# Altium schematic symbol library IC_ADI.SCHLIB: 3169 symbols (part 128 of 181) (continued)
## AD8041AR (continued)

## AD8042AN
designator U?
Double Channel Low Power Operational Amplifier, 170 MHz BW, 225 V/us SR, Industrial, 8-pin DIP (N-8), Tube; Generic Part Number: AD8042; PartNumber: AD8042AN; Amplifiers Per Package: 2; Input Bias Current: 1.2uA; Input Offset Voltage: 3mV; Iq/Amp: 7mA; Small Signal Bandwidth: 170MHz; V Span Max: 12V; V Span Min: 3V; DatasheetVersion: Rev. E; PackageVersion: 070606-A; PackageReference: N-8; PackageDescription: 8-Pin Plastic Dual In-Line Package, Row spacing 7.62 mm, Pitch 2.54 mm; Supplier Part Number 1: AD8042AN-ND; Supplier Part Number 2: 52F8033; Slew Rate: 225V/us; Mounting Technology: Through Hole; Code_JEDEC: MS-001; ComponentLink1Description: Manufacturer URL; ComponentLink2Description: Datasheet; ComponentLink3Description: Package Specification; ComponentLink4Description: Reference Circuit
footprint DIP8 (Footprint not found)
pins on every part: 4 -VS (power), 8 +VS (power)
part A pins: 1 OUT 1 (out), 2 -IN 1 (in), 3 +IN 1 (in)
part B pins: 5 +IN 2 (in), 6 -IN 2 (in), 7 OUT 2 (out)

## AD8042AR
designator U?
Double Channel Low Power Operational Amplifier, 170 MHz BW, 225 V/us SR, Industrial, 8-pin SOIC (R-8), Tube; Generic Part Number: AD8042; PartNumber: AD8042AR; Amplifiers Per Package: 2; Input Bias Current: 1.2uA; Input Offset Voltage: 3mV; Iq/Amp: 7mA; Small Signal Bandwidth: 170MHz; V Span Max: 12V; V Span Min: 3V; DatasheetVersion: Rev. E; PackageVersion: 060506-A; PackageReference: R-8; PackageDescription: 8-Pin Standard Small Outline Package, Body 3.9 x 4.9 mm, Pitch 1.27 mm; Supplier Part Number 1: AD8042AR-ND; Slew Rate: 225V/us; Mounting Technology: Surface Mount; Code_JEDEC: MS-012-AA; ComponentLink1Description: Manufacturer URL; ComponentLink2Description: Datasheet; ComponentLink3Description: Package Specification; ComponentLink4Description: Reference Circuit
footprint SOIC8_1.27 (Footprint not found)
pins on every part: 4 -VS (power), 8 +VS (power)
part A pins: 1 OUT 1 (out), 2 -IN 1 (in), 3 +IN 1 (in)
part B pins: 5 +IN 2 (in), 6 -IN 2 (in), 7 OUT 2 (out)

## AD8044AR-14
designator U?
Quad Channel Low Power Operational Amplifier, 160 MHz BW, 190 V/us SR, Industrial, 14-pin SOIC (R-14), Tube; Generic Part Number: AD8044; PartNumber: AD8044AR-14; Amplifiers Per Package: 4; Input Bias Current: 2uA; Input Offset Voltage: 1.4mV; Iq/Amp: 3.4mA; Small Signal Bandwidth: 160MHz; V Span Max: 12V; V Span Min: 3V; DatasheetVersion: Rev. B; PackageVersion: 060606-A; PackageReference: R-14; PackageDescription: 14-Pin Standard Small Outline Package, Body 8.65 x 3.9 mm, Pitch 1.27 mm; Supplier Part Number 1: AD8044AR-14-ND; Slew Rate: 190V/us; Mounting Technology: Surface Mount; Code_JEDEC: MS-012-AB; ComponentLink1Description: Manufacturer URL; ComponentLink2Description: Datasheet; ComponentLink3Description: Package Specification
footprint SOIC14_1.27 (Footprint not found)
pins on every part: 4 +V (power), 11 -V (power)
part A pins: 1 OUT A (out), 2 -IN A (in), 3 +IN A (in)
part B pins: 5 +IN B (in), 6 -IN B (in), 7 OUT B (out)
part C pins: 8 OUT C (out), 9 -IN C (in), 10 +IN C (in)
part D pins: 12 +IN D (in), 13 -IN D (in), 14 OUT D (out)

## AD8045ACPZ-R2
designator U?
Single Channel Ultra Low Distortion  Operational Amplifier, 1 GHz BW, 1.35 KV/us SR, Industrial, 8-pin QFN (CP-8-2), Reel; Generic Part Number: AD8045; PartNumber: AD8045ACPZ-R2; Amplifiers Per Package: 1; Input Bias Current: 2uA; Input Offset Voltage: 200uV; Iq/Amp: 19mA; Small Signal Bandwidth: 1GHz; V Span Max: 12V; V Span Min: 3.3V; DatasheetVersion: Rev. A; PackageVersion: 061507-B; PackageReference: CP-8-2; PackageDescription: 8-Pin Lead Frame Chip Scale Package, Body 3 x 3 mm, Pitch 0.5 mm; Supplier Part Number 1: 1078299; Supplier Part Number 2: 1078299RL; Supplier Part Number 3: 59K6288; Slew Rate: 1.35KV/us; Mounting Technology: Surface Mount; ComponentLink1Description: Manufacturer URL; ComponentLink2Description: Datasheet; ComponentLink3Description: Package Specification
footprint DFN8_0.5-PAD(3X3) (Footprint not found)
pins: 1 NC "No Connect", 2 FEEDBACK (out) "Feedback Pin", 3 -IN (in) "Inverting Input", 4 +IN (in) "Noninverting Input", 5 -VS (power) "Negative Supply", 6 NC "No Connect", 7 OUT (out) "Output", 8 +VS (power) "Positive Supply", 9 EP (power) "Must Be Connected to -VS or Electrically Isolated"

## AD8045ARDZ
designator U?
Single Channel Ultra Low Distortion  Operational Amplifier, 1 GHz BW, 1.35 KV/us SR, Industrial, 8-pin SOIC (RD-8-1), Tube; Generic Part Number: AD8045; PartNumber: AD8045ARDZ; Amplifiers Per Package: 1; Input Bias Current: 2uA; Input Offset Voltage: 200uV; Iq/Amp: 19mA; Small Signal Bandwidth: 1GHz; V Span Max: 12V; V Span Min: 3.3V; DatasheetVersion: Rev. A; PackageVersion: 060506-A; PackageReference: RD-8-1; PackageDescription: 8-Pin Standard Small Outline Package, Body 4.9 x 3.9 mm, Pitch 1.27 mm; Supplier Part Number 1: AD8045ARDZ-ND; Supplier Part Number 2: 9079424; Supplier Part Number 3: 19M0920; Slew Rate: 1.35KV/us; Mounting Technology: Surface Mount; Code_JEDEC: MS-012-AA; ComponentLink1Description: Manufacturer URL; ComponentLink2Description: Datasheet; ComponentLink3Description: Package Specification
footprint SOIC8_1.27-PAD (Footprint not found)
pins: 1 FEEDBACK (out) "Feedback Pin", 2 -IN (in) "Inverting Input", 3 +IN (in) "Noninverting Input", 4 -VS (power) "Negative Supply", 5 NC, 6 OUT (out) "Output", 7 +VS (power) "Positive Supply", 8 NC, 9 EP (power) "Must Be Connected to -VS or Electrically Isolated"

## AD8051AR
designator U?
Single Channel Single-Supply Operation Operational Amplifier, 110 MHz BW, 170 V/us SR, Industrial, 8-pin SOIC (R-8), Tube; Generic Part Number: AD8051; PartNumber: AD8051AR; Amplifiers Per Package: 1; Input Bias Current: 1.4uA; Input Offset Voltage: 1.7mV; Iq/Amp: 5.5mA; Small Signal Bandwidth: 110MHz; V Span Max: 12V; V Span Min: 3V; DatasheetVersion: Rev. J; PackageVersion: 060506-A; PackageReference: R-8; PackageDescription: 8-Pin Standard Small Outline Package, Body 3.9 x 4.9 mm, Pitch 1.27 mm; Supplier Part Number 1: AD8051AR-ND; Packing: Tube; Slew Rate: 170V/us; Mounting Technology: Surface Mount; Code_JEDEC: MS-012-AA; ComponentLink1Description: Manufacturer URL; ComponentLink2Description: Datasheet; ComponentLink3Description: Package Specification
footprint SOIC8_1.27 (Footprint not found)
part A pins: 2 -IN (in), 3 +IN (in), 4 -VS (power), 6 VOUT (out), 7 +VS (power)
part B pins: 1 NC, 5 NC, 8 NC

## AD8051ART-R2
designator U?
Single Channel Single-Supply Operation Operational Amplifier, 110 MHz BW, 170 V/us SR, Industrial, 5-pin SOT23 (RJ-5), Reel; Generic Part Number: AD8051; PartNumber: AD8051ART-R2; Amplifiers Per Package: 1; Input Bias Current: 1.4uA; Input Offset Voltage: 1.7mV; Iq/Amp: 5.5mA; Small Signal Bandwidth: 110MHz; V Span Max: 12V; V Span Min: 3V; DatasheetVersion: Rev. J; PackageVersion: 121608-A; PackageReference: RJ-5; PackageDescription: 5-Pin Small Outline Transistor Package, Body 2.9 x 1.6 mm, Pitch 0.95 mm; Supplier Part Number 1: 19M8877; Packing: Reel; Slew Rate: 170V/us; Mounting Technology: Surface Mount; Code_JEDEC: MO-178-AA; ComponentLink1Description: Manufacturer URL; ComponentLink2Description: Datasheet; ComponentLink3Description: Package Specification
footprint SOT23-5 (Footprint not found)
pins: 1 VOUT (out), 2 -VS (power), 3 +IN (in), 4 -IN (in), 5 +VS (power)

## AD8051ARTZ-R2
designator U?
Single Channel Single-Supply Operation Operational Amplifier, 110 MHz BW, 170 V/us SR, Industrial, 5-pin SOT23 (RJ-5), Reel; Generic Part Number: AD8051; PartNumber: AD8051ARTZ-R2; Amplifiers Per Package: 1; Input Bias Current: 1.4uA; Input Offset Voltage: 1.7mV; Iq/Amp: 5.5mA; Small Signal Bandwidth: 110MHz; V Span Max: 12V; V Span Min: 3V; DatasheetVersion: Rev. J; PackageVersion: 121608-A; PackageReference: RJ-5; PackageDescription: 5-Pin Small Outline Transistor Package, Body 2.9 x 1.6 mm, Pitch 0.95 mm; Supplier Part Number 1: 59K6298; Packing: Reel; Slew Rate: 170V/us; Mounting Technology: Surface Mount; Code_JEDEC: MO-178-AA; ComponentLink1Description: Manufacturer URL; ComponentLink2Description: Datasheet; ComponentLink3Description: Package Specification
footprint SOT23-5 (Footprint not found)
pins: 1 VOUT (out), 2 -VS (power), 3 +IN (in), 4 -IN (in), 5 +VS (power)

## AD8052AR
designator U?
Double Channel Single-Supply Operation Operational Amplifier, 110 MHz BW, 170 V/us SR, Industrial, 8-pin SOIC (R-8), Tube; Generic Part Number: AD8052; PartNumber: AD8052AR; Amplifiers Per Package: 2; Input Bias Current: 1.4uA; Input Offset Voltage: 1.7mV; Iq/Amp: 5.5mA; Small Signal Bandwidth: 110MHz; V Span Max: 12V; V Span Min: 3V; DatasheetVersion: Rev. J; PackageVersion: 060506-A; PackageReference: R-8; PackageDescription: 8-Pin Standard Small Outline Package, Body 3.9 x 4.9 mm, Pitch 1.27 mm; Supplier Part Number 1: AD8052AR-ND; Packing: Tube; Slew Rate: 170V/us; Mounting Technology: Surface Mount; Code_JEDEC: MS-012-AA; ComponentLink1Description: Manufacturer URL; ComponentLink2Description: Datasheet; ComponentLink3Description: Package Specification
footprint SOIC8_1.27 (Footprint not found)
pins on every part: 4 -VS (power), 8 +VS (power)
part A pins: 1 OUT 1 (out), 2 -IN 1 (in), 3 +IN 1 (in)
part B pins: 5 +IN 2 (in), 6 -IN 2 (in), 7 OUT 2 (out)

## AD8052ARM
designator U?
Double Channel Single-Supply Operation Operational Amplifier, 110 MHz BW, 170 V/us SR, Industrial, 8-pin SOP (RM-8), Tube; Generic Part Number: AD8052; PartNumber: AD8052ARM; Amplifiers Per Package: 2; Input Bias Current: 1.4uA; Input Offset Voltage: 1.7mV; Iq/Amp: 5.5mA; Small Signal Bandwidth: 110MHz; V Span Max: 12V; V Span Min: 3V; DatasheetVersion: Rev. J; PackageReference: RM-8; PackageDescription: 8-Pin Mini Small Outline Package, Body 3 x 3 mm, Pitch 0.65 mm; Supplier Part Number 1: AD8052ARM-ND; Packing: Tube; Slew Rate: 170V/us; Mounting Technology: Surface Mount; Code_JEDEC: MO-187-AA; ComponentLink1Description: Manufacturer URL; ComponentLink2Description: Datasheet; ComponentLink3Description: Package Specification
footprint VSSOP8_0.65 (Footprint not found)
pins on every part: 4 -VS (power), 8 +VS (power)
part A pins: 1 OUT 1 (out), 2 -IN 1 (in), 3 +IN 1 (in)
part B pins: 5 +IN 2 (in), 6 -IN 2 (in), 7 OUT 2 (out)

## AD8052ARMZ
designator U?
Double Channel Single-Supply Operation Operational Amplifier, 110 MHz BW, 170 V/us SR, Industrial, 8-pin SOP (RM-8), Tube; Generic Part Number: AD8052; PartNumber: AD8052ARMZ; Amplifiers Per Package: 2; Input Bias Current: 1.4uA; Input Offset Voltage: 1.7mV; Iq/Amp: 5.5mA; Small Signal Bandwidth: 110MHz; V Span Max: 12V; V Span Min: 3V; DatasheetVersion: Rev. J; PackageReference: RM-8; PackageDescription: 8-Pin Mini Small Outline Package, Body 3 x 3 mm, Pitch 0.65 mm; Supplier Part Number 1: AD8052ARMZ-ND; Supplier Part Number 2: 1660978; Supplier Part Number 3: 19M8878; Packing: Tube; Slew Rate: 170V/us; Mounting Technology: Surface Mount; Code_JEDEC: MO-187-AA; ComponentLink1Description: Manufacturer URL; ComponentLink2Description: Datasheet; ComponentLink3Description: Package Specification
footprint VSSOP8_0.65 (Footprint not found)
pins on every part: 4 -VS (power), 8 +VS (power)
part A pins: 1 OUT 1 (out), 2 -IN 1 (in), 3 +IN 1 (in)
part B pins: 5 +IN 2 (in), 6 -IN 2 (in), 7 OUT 2 (out)

## AD8054AR
designator U?
Quad Channel Single-Supply Operation Operational Amplifier, 150 MHz BW, 170 V/us SR, Industrial, 14-pin SOIC (R-14), Tube; Generic Part Number: AD8054; PartNumber: AD8054AR; Amplifiers Per Package: 4; Input Bias Current: 2uA; Input Offset Voltage: 1.7mV; Iq/Amp: 3.4mA; Small Signal Bandwidth: 150MHz; V Span Max: 12V; V Span Min: 3V; DatasheetVersion: Rev. J; PackageVersion: 060606-A; PackageReference: R-14; PackageDescription: 14-Pin Standard Small Outline Package, Body 8.65 x 3.9 mm, Pitch 1.27 mm; Supplier Part Number 1: AD8054AR-ND; Packing: Tube; Slew Rate: 170V/us; Mounting Technology: Surface Mount; Code_JEDEC: MS-012-AB; ComponentLink1Description: Manufacturer URL; ComponentLink2Description: Datasheet; ComponentLink3Description: Package Specification
footprint SOIC14_1.27 (Footprint not found)
pins on every part: 4 +V (power), 11 -V (power)
part A pins: 1 OUT A (out), 2 -IN A (in), 3 +IN A (in)
part B pins: 5 +IN B (in), 6 -IN B (in), 7 OUT B (out)
part C pins: 8 OUT C (out), 9 -IN C (in), 10 +IN C (in)
part D pins: 12 +IN D (in), 13 -IN D (in), 14 OUT D (out)

## AD8054ARU
designator U?
Quad Channel Single-Supply Operation Operational Amplifier, 150 MHz BW, 170 V/us SR, Industrial, 14-pin SOP (RU-14), Tube; Generic Part Number: AD8054; PartNumber: AD8054ARU; Amplifiers Per Package: 4; Input Bias Current: 2uA; Input Offset Voltage: 1.7mV; Iq/Amp: 3.4mA; Small Signal Bandwidth: 150MHz; V Span Max: 12V; V Span Min: 3V; DatasheetVersion: Rev. J; PackageReference: RU-14; PackageDescription: 14-Pin Thin Shrink Small Outline Package, Body 5 x 4.4 mm, Pitch 0.65 mm; Supplier Part Number 1: AD8054ARU-ND; Packing: Tube; Slew Rate: 170V/us; Mounting Technology: Surface Mount; Code_JEDEC: MO-153AB-1; ComponentLink1Description: Manufacturer URL; ComponentLink2Description: Datasheet; ComponentLink3Description: Package Specification
footprint TSSOP14_0.65 (Footprint not found)
pins on every part: 4 +V (power), 11 -V (power)
part A pins: 1 OUT A (out), 2 -IN A (in), 3 +IN A (in)
part B pins: 5 +IN B (in), 6 -IN B (in), 7 OUT B (out)
part C pins: 8 OUT C (out), 9 -IN C (in), 10 +IN C (in)
part D pins: 12 +IN D (in), 13 -IN D (in), 14 OUT D (out)

## AD8055AR
designator U?
Single Channel Low Power Operational Amplifier, 300 MHz BW, 1.4 KV/us SR, Industrial, 8-pin SOIC (R-8), Tube; Generic Part Number: AD8055; PartNumber: AD8055AR; Amplifiers Per Package: 1; Input Bias Current: 400nA; Input Offset Voltage: 3mV; Iq/Amp: 6.5mA; Small Signal Bandwidth: 300MHz; V Span Max: 12V; V Span Min: 8V; DatasheetVersion: Rev. J; PackageVersion: 060506-A; PackageReference: R-8; PackageDescription: 8-Pin Standard Small Outline Package, Body 3.9 x 4.9 mm, Pitch 1.27 mm; Supplier Part Number 1: AD8055AR-ND; Packing: Tube; Slew Rate: 1.4KV/us; Mounting Technology: Surface Mount; Code_JEDEC: MS-012-AA; ComponentLink1Description: Manufacturer URL; ComponentLink2Description: Datasheet; ComponentLink3Description: Package Specification
footprint SOIC8_1.27 (Footprint not found)
part A pins: 2 -IN (in), 3 +IN (in), 4 -VS (power), 6 VOUT (out), 7 +VS (power)
part B pins: 1 NC, 5 NC, 8 NC

## AD8055ART-R2
designator U?
Single Channel Low Power Operational Amplifier, 300 MHz BW, 1.4 KV/us SR, Industrial, 5-pin SOT23 (RJ-5), Reel; Generic Part Number: AD8055; PartNumber: AD8055ART-R2; Amplifiers Per Package: 1; Input Bias Current: 400nA; Input Offset Voltage: 3mV; Iq/Amp: 6.5mA; Small Signal Bandwidth: 300MHz; V Span Max: 12V; V Span Min: 8V; DatasheetVersion: Rev. J; PackageVersion: 121608-A; PackageReference: RJ-5; PackageDescription: 5-Pin Small Outline Transistor Package, Body 2.9 x 1.6 mm, Pitch 0.95 mm; Packing: Reel; Slew Rate: 1.4KV/us; Mounting Technology: Surface Mount; Code_JEDEC: MO-178-AA; ComponentLink1Description: Manufacturer URL; ComponentLink2Description: Datasheet; ComponentLink3Description: Package Specification
footprint SOT23-5 (Footprint not found)
pins: 1 VOUT (out), 2 -VS (power), 3 +IN (in), 4 -IN (in), 5 +VS (power)

## AD8055ARTZ-R2
designator U?
Single Channel Low Power Operational Amplifier, 300 MHz BW, 1.4 KV/us SR, Industrial, 5-pin SOT23 (RJ-5), Reel; Generic Part Number: AD8055; PartNumber: AD8055ARTZ-R2; Amplifiers Per Package: 1; Input Bias Current: 400nA; Input Offset Voltage: 3mV; Iq/Amp: 6.5mA; Small Signal Bandwidth: 300MHz; V Span Max: 12V; V Span Min: 8V; DatasheetVersion: Rev. J; PackageVersion: 121608-A; PackageReference: RJ-5; PackageDescription: 5-Pin Small Outline Transistor Package, Body 2.9 x 1.6 mm, Pitch 0.95 mm; Supplier Part Number 1: 1660979RL; Supplier Part Number 2: 1660979; Supplier Part Number 3: 45P6068; Packing: Reel; Slew Rate: 1.4KV/us; Mounting Technology: Surface Mount; Code_JEDEC: MO-178-AA; ComponentLink1Description: Manufacturer URL; ComponentLink2Description: Datasheet; ComponentLink3Description: Package Specification
footprint SOT23-5 (Footprint not found)
pins: 1 VOUT (out), 2 -VS (power), 3 +IN (in), 4 -IN (in), 5 +VS (power)

## AD8056AR
designator U?
Double Channel Low Power Operational Amplifier, 300 MHz BW, 1.4 KV/us SR, Industrial, 8-pin SOIC (R-8), Tube; Generic Part Number: AD8056; PartNumber: AD8056AR; Amplifiers Per Package: 2; Input Bias Current: 400nA; Input Offset Voltage: 3mV; Iq/Amp: 6mA; Small Signal Bandwidth: 300MHz; V Span Max: 12V; V Span Min: 8V; DatasheetVersion: Rev. J; PackageVersion: 060506-A; PackageReference: R-8; PackageDescription: 8-Pin Standard Small Outline Package, Body 3.9 x 4.9 mm, Pitch 1.27 mm; Supplier Part Number 1: AD8056AR-ND; Packing: Tube; Slew Rate: 1.4KV/us; Mounting Technology: Surface Mount; Code_JEDEC: MS-012-AA; ComponentLink1Description: Manufacturer URL; ComponentLink2Description: Datasheet; ComponentLink3Description: Package Specification
footprint SOIC8_1.27 (Footprint not found)
pins on every part: 4 -VS (power), 8 +VS (power)
part A pins: 1 OUT 1 (out), 2 -IN 1 (in), 3 +IN 1 (in)
part B pins: 5 +IN 2 (in), 6 -IN 2 (in), 7 OUT 2 (out)

## AD8056ARM
designator U?
Double Channel Low Power Operational Amplifier, 300 MHz BW, 1.4 KV/us SR, Industrial, 8-pin SOP (RM-8), Tube; Generic Part Number: AD8056; PartNumber: AD8056ARM; Amplifiers Per Package: 2; Input Bias Current: 400nA; Input Offset Voltage: 3mV; Iq/Amp: 6mA; Small Signal Bandwidth: 300MHz; V Span Max: 12V; V Span Min: 8V; DatasheetVersion: Rev. J; PackageReference: RM-8; PackageDescription: 8-Pin Mini Small Outline Package, Body 3 x 3 mm, Pitch 0.65 mm; Supplier Part Number 1: AD8056ARM-ND; Packing: Tube; Slew Rate: 1.4KV/us; Mounting Technology: Surface Mount; Code_JEDEC: MO-187-AA; ComponentLink1Description: Manufacturer URL; ComponentLink2Description: Datasheet; ComponentLink3Description: Package Specification
footprint VSSOP8_0.65 (Footprint not found)
pins on every part: 4 -VS (power), 8 +VS (power)
part A pins: 1 OUT 1 (out), 2 -IN 1 (in), 3 +IN 1 (in)
part B pins: 5 +IN 2 (in), 6 -IN 2 (in), 7 OUT 2 (out)

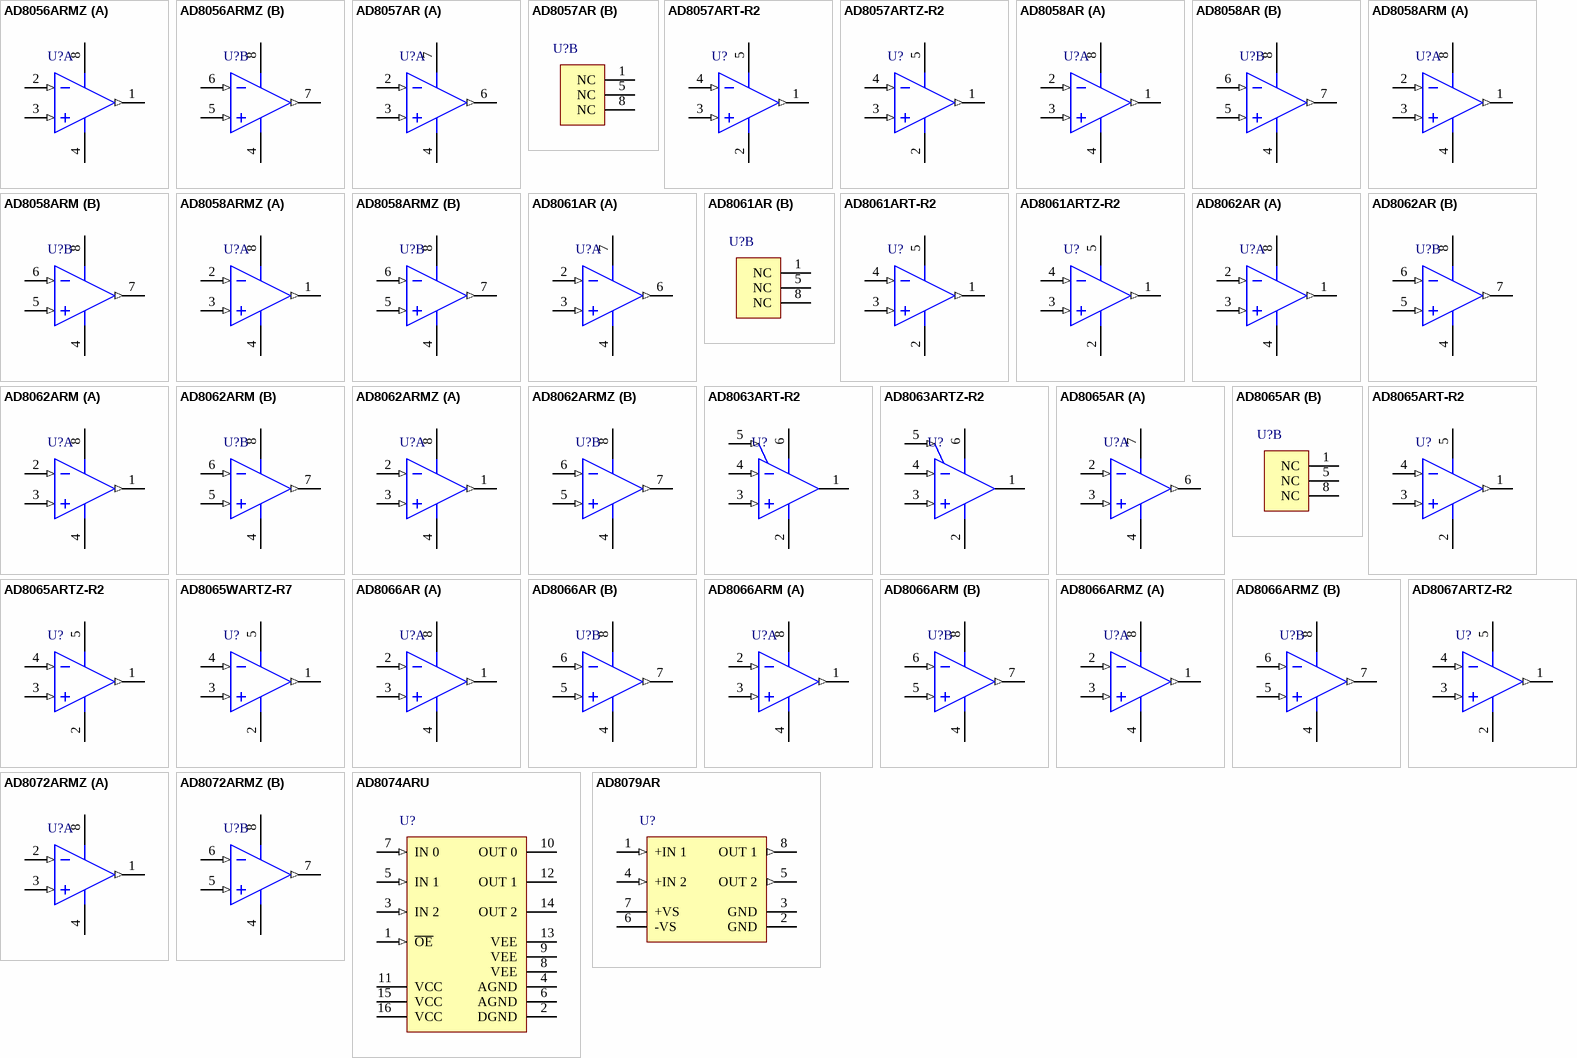
[diagram p93: symbols AD8056ARMZ to AD8079AR]

## AD8056ARMZ
designator U?
Double Channel Low Power Operational Amplifier, 300 MHz BW, 1.4 KV/us SR, Industrial, 8-pin SOP (RM-8), Tube; Generic Part Number: AD8056; PartNumber: AD8056ARMZ; Amplifiers Per Package: 2; Input Bias Current: 400nA; Input Offset Voltage: 3mV; Iq/Amp: 6mA; Small Signal Bandwidth: 300MHz; V Span Max: 12V; V Span Min: 8V; DatasheetVersion: Rev. J; PackageReference: RM-8; PackageDescription: 8-Pin Mini Small Outline Package, Body 3 x 3 mm, Pitch 0.65 mm; Supplier Part Number 1: AD8056ARMZ-ND; Supplier Part Number 2: 59K6306; Packing: Tube; Slew Rate: 1.4KV/us; Mounting Technology: Surface Mount; Code_JEDEC: MO-187-AA; ComponentLink1Description: Manufacturer URL; ComponentLink2Description: Datasheet; ComponentLink3Description: Package Specification
footprint VSSOP8_0.65 (Footprint not found)
pins on every part: 4 -VS (power), 8 +VS (power)
part A pins: 1 OUT 1 (out), 2 -IN 1 (in), 3 +IN 1 (in)
part B pins: 5 +IN 2 (in), 6 -IN 2 (in), 7 OUT 2 (out)

## AD8057AR
designator U?
Single Channel Low Power Operational Amplifier, 325 MHz BW, 1.15 KV/us SR, Industrial, 8-pin SOIC (R-8), Tube; Generic Part Number: AD8057; PartNumber: AD8057AR; Amplifiers Per Package: 1; Input Bias Current: 500nA; Input Offset Voltage: 1mV; Iq/Amp: 7.5mA; Small Signal Bandwidth: 325MHz; V Span Max: 12V; V Span Min: 3V; DatasheetVersion: Rev. C; PackageVersion: 060506-A; PackageReference: R-8; PackageDescription: 8-Pin Standard Small Outline Package, Body 3.9 x 4.9 mm, Pitch 1.27 mm; Supplier Part Number 1: AD8057AR-ND; Slew Rate: 1.15KV/us; Mounting Technology: Surface Mount; Code_JEDEC: MS-012-AA; ComponentLink1Description: Manufacturer URL; ComponentLink2Description: Datasheet; ComponentLink3Description: Package Specification
footprint SOIC8_1.27 (Footprint not found)
part A pins: 2 -IN (in), 3 +IN (in), 4 -VS (power), 6 VOUT (out), 7 +VS (power)
part B pins: 1 NC, 5 NC, 8 NC

## AD8057ART-R2
designator U?
Single Channel Low Power Operational Amplifier, 325 MHz BW, 1.15 KV/us SR, Industrial, 5-pin SOT23 (RJ-5), Reel; Generic Part Number: AD8057; PartNumber: AD8057ART-R2; Amplifiers Per Package: 1; Input Bias Current: 500nA; Input Offset Voltage: 1mV; Iq/Amp: 7.5mA; Small Signal Bandwidth: 325MHz; V Span Max: 12V; V Span Min: 3V; DatasheetVersion: Rev. C; PackageVersion: 121608-A; PackageReference: RJ-5; PackageDescription: 5-Pin Small Outline Transistor Package, Body 2.9 x 1.6 mm, Pitch 0.95 mm; Supplier Part Number 1: 61H4962; Slew Rate: 1.15KV/us; Mounting Technology: Surface Mount; Code_JEDEC: MO-178-AA; ComponentLink1Description: Manufacturer URL; ComponentLink2Description: Datasheet; ComponentLink3Description: Package Specification
footprint SOT23-5 (Footprint not found)
pins: 1 VOUT (out), 2 -VS (power), 3 +IN (in), 4 -IN (in), 5 +VS (power)

## AD8057ARTZ-R2
designator U?
Single Channel Low Power Operational Amplifier, 325 MHz BW, 1.15 KV/us SR, Industrial, 5-pin SOT23 (RJ-5), Reel; Generic Part Number: AD8057; PartNumber: AD8057ARTZ-R2; Amplifiers Per Package: 1; Input Bias Current: 500nA; Input Offset Voltage: 1mV; Iq/Amp: 7.5mA; Small Signal Bandwidth: 325MHz; V Span Max: 12V; V Span Min: 3V; DatasheetVersion: Rev. C; PackageVersion: 121608-A; PackageReference: RJ-5; PackageDescription: 5-Pin Small Outline Transistor Package, Body 2.9 x 1.6 mm, Pitch 0.95 mm; Supplier Part Number 1: 88H0151; Slew Rate: 1.15KV/us; Mounting Technology: Surface Mount; Code_JEDEC: MO-178-AA; ComponentLink1Description: Manufacturer URL; ComponentLink2Description: Datasheet; ComponentLink3Description: Package Specification
footprint SOT23-5 (Footprint not found)
pins: 1 VOUT (out), 2 -VS (power), 3 +IN (in), 4 -IN (in), 5 +VS (power)

## AD8058AR
designator U?
Double Channel Low Power Operational Amplifier, 325 MHz BW, 1.15 KV/us SR, Industrial, 8-pin SOIC (R-8), Tube; Generic Part Number: AD8058; PartNumber: AD8058AR; Amplifiers Per Package: 2; Input Bias Current: 500nA; Input Offset Voltage: 1mV; Iq/Amp: 7.5mA; Small Signal Bandwidth: 325MHz; V Span Max: 12V; V Span Min: 3V; DatasheetVersion: Rev. C; PackageVersion: 060506-A; PackageReference: R-8; PackageDescription: 8-Pin Standard Small Outline Package, Body 3.9 x 4.9 mm, Pitch 1.27 mm; Supplier Part Number 1: AD8058AR-ND; Slew Rate: 1.15KV/us; Mounting Technology: Surface Mount; Code_JEDEC: MS-012-AA; ComponentLink1Description: Manufacturer URL; ComponentLink2Description: Datasheet; ComponentLink3Description: Package Specification
footprint SOIC8_1.27 (Footprint not found)
pins on every part: 4 -VS (power), 8 +VS (power)
part A pins: 1 OUT 1 (out), 2 -IN 1 (in), 3 +IN 1 (in)
part B pins: 5 +IN 2 (in), 6 -IN 2 (in), 7 OUT 2 (out)

## AD8058ARM
designator U?
Double Channel Low Power Operational Amplifier, 325 MHz BW, 1.15 KV/us SR, Industrial, 8-pin SOP (RM-8), Tube; Generic Part Number: AD8058; PartNumber: AD8058ARM; Amplifiers Per Package: 2; Input Bias Current: 500nA; Input Offset Voltage: 1mV; Iq/Amp: 7.5mA; Small Signal Bandwidth: 325MHz; V Span Max: 12V; V Span Min: 3V; DatasheetVersion: Rev. C; PackageReference: RM-8; PackageDescription: 8-Pin Mini Small Outline Package, Body 3 x 3 mm, Pitch 0.65 mm; Supplier Part Number 1: AD8058ARM-ND; Slew Rate: 1.15KV/us; Mounting Technology: Surface Mount; Code_JEDEC: MO-187-AA; ComponentLink1Description: Manufacturer URL; ComponentLink2Description: Datasheet; ComponentLink3Description: Package Specification
footprint VSSOP8_0.65 (Footprint not found)
pins on every part: 4 -VS (power), 8 +VS (power)
part A pins: 1 OUT 1 (out), 2 -IN 1 (in), 3 +IN 1 (in)
part B pins: 5 +IN 2 (in), 6 -IN 2 (in), 7 OUT 2 (out)

## AD8058ARMZ
designator U?
Double Channel Low Power Operational Amplifier, 325 MHz BW, 1.15 KV/us SR, Industrial, 8-pin SOP (RM-8), Tube; Generic Part Number: AD8058; PartNumber: AD8058ARMZ; Amplifiers Per Package: 2; Input Bias Current: 500nA; Input Offset Voltage: 1mV; Iq/Amp: 7.5mA; Small Signal Bandwidth: 325MHz; V Span Max: 12V; V Span Min: 3V; DatasheetVersion: Rev. C; PackageReference: RM-8; PackageDescription: 8-Pin Mini Small Outline Package, Body 3 x 3 mm, Pitch 0.65 mm; Supplier Part Number 1: AD8058ARMZ-ND; Supplier Part Number 2: 82H2964; Slew Rate: 1.15KV/us; Mounting Technology: Surface Mount; Code_JEDEC: MO-187-AA; ComponentLink1Description: Manufacturer URL; ComponentLink2Description: Datasheet; ComponentLink3Description: Package Specification
footprint VSSOP8_0.65 (Footprint not found)
pins on every part: 4 -VS (power), 8 +VS (power)
part A pins: 1 OUT 1 (out), 2 -IN 1 (in), 3 +IN 1 (in)
part B pins: 5 +IN 2 (in), 6 -IN 2 (in), 7 OUT 2 (out)

## AD8061AR
designator U?
Single Channel Low Offset Voltage Operational Amplifier, 320 MHz BW, 650 V/us SR, Industrial, 8-pin SOIC (R-8), Tube; Generic Part Number: AD8061; PartNumber: AD8061AR; Amplifiers Per Package: 1; Input Bias Current: 350nA; Input Offset Voltage: 1mV; Iq/Amp: 9.5mA; Small Signal Bandwidth: 320MHz; V Span Max: 8V; V Span Min: 2.7V; DatasheetVersion: Rev. G; PackageVersion: 060506-A; PackageReference: R-8; PackageDescription: 8-Pin Standard Small Outline Package, Body 3.9 x 4.9 mm, Pitch 1.27 mm; Supplier Part Number 1: AD8061AR-ND; Slew Rate: 650V/us; Mounting Technology: Surface Mount; Code_JEDEC: MS-012-AA; ComponentLink1Description: Manufacturer URL; ComponentLink2Description: Datasheet; ComponentLink3Description: Package Specification
footprint SOIC8_1.27 (Footprint not found)
part A pins: 2 -IN (in), 3 +IN (in), 4 -VS (power), 6 VOUT (out), 7 +VS (power)
part B pins: 1 NC, 5 NC, 8 NC

## AD8061ART-R2
designator U?
Single Channel Low Offset Voltage Operational Amplifier, 320 MHz BW, 650 V/us SR, Industrial, 5-pin SOT23 (RJ-5), Reel; Generic Part Number: AD8061; PartNumber: AD8061ART-R2; Amplifiers Per Package: 1; Input Bias Current: 350nA; Input Offset Voltage: 1mV; Iq/Amp: 9.5mA; Small Signal Bandwidth: 320MHz; V Span Max: 8V; V Span Min: 2.7V; DatasheetVersion: Rev. G; PackageVersion: 121608-A; PackageReference: RJ-5; PackageDescription: 5-Pin Small Outline Transistor Package, Body 2.9 x 1.6 mm, Pitch 0.95 mm; Supplier Part Number 1: 61H4963; Slew Rate: 650V/us; Mounting Technology: Surface Mount; Code_JEDEC: MO-178-AA; ComponentLink1Description: Manufacturer URL; ComponentLink2Description: Datasheet; ComponentLink3Description: Package Specification
footprint SOT23-5 (Footprint not found)
pins: 1 VOUT (out), 2 -VS (power), 3 +IN (in), 4 -IN (in), 5 +VS (power)

## AD8061ARTZ-R2
designator U?
Single Channel Low Offset Voltage Operational Amplifier, 320 MHz BW, 650 V/us SR, Industrial, 5-pin SOT23 (RJ-5), Reel; Generic Part Number: AD8061; PartNumber: AD8061ARTZ-R2; Amplifiers Per Package: 1; Input Bias Current: 350nA; Input Offset Voltage: 1mV; Iq/Amp: 9.5mA; Small Signal Bandwidth: 320MHz; V Span Max: 8V; V Span Min: 2.7V; DatasheetVersion: Rev. G; PackageVersion: 121608-A; PackageReference: RJ-5; PackageDescription: 5-Pin Small Outline Transistor Package, Body 2.9 x 1.6 mm, Pitch 0.95 mm; Supplier Part Number 1: 88H0157; Slew Rate: 650V/us; Mounting Technology: Surface Mount; Code_JEDEC: MO-178-AA; ComponentLink1Description: Manufacturer URL; ComponentLink2Description: Datasheet; ComponentLink3Description: Package Specification
footprint SOT23-5 (Footprint not found)
pins: 1 VOUT (out), 2 -VS (power), 3 +IN (in), 4 -IN (in), 5 +VS (power)

## AD8062AR
designator U?
Double Channel Low Offset Voltage Operational Amplifier, 320 MHz BW, 650 V/us SR, Industrial, 8-pin SOIC (R-8), Tube; Generic Part Number: AD8062; PartNumber: AD8062AR; Amplifiers Per Package: 2; Input Bias Current: 350nA; Input Offset Voltage: 1mV; Iq/Amp: 9.5mA; Small Signal Bandwidth: 320MHz; V Span Max: 8V; V Span Min: 2.7V; DatasheetVersion: Rev. G; PackageVersion: 060506-A; PackageReference: R-8; PackageDescription: 8-Pin Standard Small Outline Package, Body 3.9 x 4.9 mm, Pitch 1.27 mm; Supplier Part Number 1: AD8062AR-ND; Slew Rate: 650V/us; Mounting Technology: Surface Mount; Code_JEDEC: MS-012-AA; ComponentLink1Description: Manufacturer URL; ComponentLink2Description: Datasheet; ComponentLink3Description: Package Specification
footprint SOIC8_1.27 (Footprint not found)
pins on every part: 4 -VS (power), 8 +VS (power)
part A pins: 1 VOUT 1 (out), 2 -IN 1 (in), 3 +IN 1 (in)
part B pins: 5 +IN 2 (in), 6 -IN 2 (in), 7 VOUT 2 (out)

## AD8062ARM
designator U?
Double Channel Low Offset Voltage Operational Amplifier, 320 MHz BW, 650 V/us SR, Industrial, 8-pin SOP (RM-8), Tube; Generic Part Number: AD8062; PartNumber: AD8062ARM; Amplifiers Per Package: 2; Input Bias Current: 350nA; Input Offset Voltage: 1mV; Iq/Amp: 9.5mA; Small Signal Bandwidth: 320MHz; V Span Max: 8V; V Span Min: 2.7V; DatasheetVersion: Rev. G; PackageReference: RM-8; PackageDescription: 8-Pin Mini Small Outline Package, Body 3 x 3 mm, Pitch 0.65 mm; Supplier Part Number 1: AD8062ARM-ND; Supplier Part Number 2: 98B7373; Slew Rate: 650V/us; Mounting Technology: Surface Mount; Code_JEDEC: MO-187-AA; ComponentLink1Description: Manufacturer URL; ComponentLink2Description: Datasheet; ComponentLink3Description: Package Specification
footprint VSSOP8_0.65 (Footprint not found)
pins on every part: 4 -VS (power), 8 +VS (power)
part A pins: 1 VOUT 1 (out), 2 -IN 1 (in), 3 +IN 1 (in)
part B pins: 5 +IN 2 (in), 6 -IN 2 (in), 7 VOUT 2 (out)

## AD8062ARMZ
designator U?
Double Channel Low Offset Voltage Operational Amplifier, 320 MHz BW, 650 V/us SR, Industrial, 8-pin SOP (RM-8), Tube; Generic Part Number: AD8062; PartNumber: AD8062ARMZ; Amplifiers Per Package: 2; Input Bias Current: 350nA; Input Offset Voltage: 1mV; Iq/Amp: 9.5mA; Small Signal Bandwidth: 320MHz; V Span Max: 8V; V Span Min: 2.7V; DatasheetVersion: Rev. G; PackageReference: RM-8; PackageDescription: 8-Pin Mini Small Outline Package, Body 3 x 3 mm, Pitch 0.65 mm; Supplier Part Number 1: AD8062ARMZ-ND; Supplier Part Number 2: 74R5999; Slew Rate: 650V/us; Mounting Technology: Surface Mount; Code_JEDEC: MO-187-AA; ComponentLink1Description: Manufacturer URL; ComponentLink2Description: Datasheet; ComponentLink3Description: Package Specification
footprint VSSOP8_0.65 (Footprint not found)
pins on every part: 4 -VS (power), 8 +VS (power)
part A pins: 1 VOUT 1 (out), 2 -IN 1 (in), 3 +IN 1 (in)
part B pins: 5 +IN 2 (in), 6 -IN 2 (in), 7 VOUT 2 (out)

## AD8063ART-R2
designator U?
Single Channel Rail-to-Rail Operational Amplifier, 320 MHz BW, 650 V/us SR, Industrial, 6-pin SOT23 (RJ-6), Reel; Generic Part Number: AD8063; PartNumber: AD8063ART-R2; Amplifiers Per Package: 1; Input Bias Current: 350nA; Input Offset Voltage: 1mV; Iq/Amp: 9.5mA; Small Signal Bandwidth: 320MHz; V Span Max: 8V; V Span Min: 2.7V; DatasheetVersion: Rev. G; PackageVersion: 121608-A; PackageReference: RJ-6; PackageDescription: 6-Pin Small Outline Transistor Package, Body 2.9 x 1.6 mm, Pitch 0.95 mm; Slew Rate: 650V/us; Mounting Technology: Surface Mount; Code_JEDEC: MO-178-AB; ComponentLink1Description: Manufacturer URL; ComponentLink2Description: Datasheet; ComponentLink3Description: Package Specification
footprint SOT23-6 (Footprint not found)
pins: 1 VOUT (hiz), 2 -VS (power), 3 +IN (in), 4 -IN (in), 5 ~{DISABLE} (in), 6 +VS (power)

## AD8063ARTZ-R2
designator U?
Single Channel Rail-to-Rail Operational Amplifier, 320 MHz BW, 650 V/us SR, Industrial, 6-pin SOT23 (RJ-6), Reel; Generic Part Number: AD8063; PartNumber: AD8063ARTZ-R2; Amplifiers Per Package: 1; Input Bias Current: 350nA; Input Offset Voltage: 1mV; Iq/Amp: 9.5mA; Small Signal Bandwidth: 320MHz; V Span Max: 8V; V Span Min: 2.7V; DatasheetVersion: Rev. G; PackageVersion: 121608-A; PackageReference: RJ-6; PackageDescription: 6-Pin Small Outline Transistor Package, Body 2.9 x 1.6 mm, Pitch 0.95 mm; Slew Rate: 650V/us; Mounting Technology: Surface Mount; Code_JEDEC: MO-178-AB; ComponentLink1Description: Manufacturer URL; ComponentLink2Description: Datasheet; ComponentLink3Description: Package Specification
footprint SOT23-6 (Footprint not found)
pins: 1 VOUT (hiz), 2 -VS (power), 3 +IN (in), 4 -IN (in), 5 ~{DISABLE} (in), 6 +VS (power)

## AD8065AR
designator U?
Single Channel Low Power Operational Amplifier, 145 MHz BW, 180 V/us SR, Industrial, 8-pin SOIC (R-8), Tube; Generic Part Number: AD8065; PartNumber: AD8065AR; Amplifiers Per Package: 1; Automotive Qualified: Yes; Input Bias Current: 2pA; Input Offset Voltage: 400uV; Iq/Amp: 7.4mA; Small Signal Bandwidth: 145MHz; V Span Max: 24V; V Span Min: 5V; DatasheetVersion: Rev. J; PackageVersion: 060506-A; PackageReference: R-8; PackageDescription: 8-Pin Standard Small Outline Package, Body 3.9 x 4.9 mm, Pitch 1.27 mm; Supplier Part Number 1: AD8065AR-ND; Slew Rate: 180V/us; Mounting Technology: Surface Mount; Code_JEDEC: MS-012-AA; ComponentLink1Description: Manufacturer URL; ComponentLink2Description: Datasheet; ComponentLink3Description: Package Specification; ComponentLink4Description: Reference Circuit
footprint SOIC8_1.27 (Footprint not found)
part A pins: 2 -IN (in), 3 +IN (in), 4 -VS (power), 6 VOUT (out), 7 +VS (power)
part B pins: 1 NC, 5 NC, 8 NC

## AD8065ART-R2
designator U?
Single Channel Low Power Operational Amplifier, 145 MHz BW, 180 V/us SR, Industrial, 5-pin SOT23 (RJ-5), Reel; Generic Part Number: AD8065; PartNumber: AD8065ART-R2; Amplifiers Per Package: 1; Automotive Qualified: Yes; Input Bias Current: 2pA; Input Offset Voltage: 400uV; Iq/Amp: 7.4mA; Small Signal Bandwidth: 145MHz; V Span Max: 24V; V Span Min: 5V; DatasheetVersion: Rev. J; PackageVersion: 121608-A; PackageReference: RJ-5; PackageDescription: 5-Pin Small Outline Transistor Package, Body 2.9 x 1.6 mm, Pitch 0.95 mm; Supplier Part Number 1: 61H4965; Slew Rate: 180V/us; Mounting Technology: Surface Mount; Code_JEDEC: MO-178-AA; ComponentLink1Description: Manufacturer URL; ComponentLink2Description: Datasheet; ComponentLink3Description: Package Specification; ComponentLink4Description: Reference Circuit
footprint SOT23-5 (Footprint not found)
pins: 1 VOUT (out), 2 -VS (power), 3 +IN (in), 4 -IN (in), 5 +VS (power)

## AD8065ARTZ-R2
designator U?
Single Channel Low Power Operational Amplifier, 145 MHz BW, 180 V/us SR, Industrial, 5-pin SOT23 (RJ-5), Reel; Generic Part Number: AD8065; PartNumber: AD8065ARTZ-R2; Amplifiers Per Package: 1; Automotive Qualified: Yes; Input Bias Current: 2pA; Input Offset Voltage: 400uV; Iq/Amp: 7.4mA; Small Signal Bandwidth: 145MHz; V Span Max: 24V; V Span Min: 5V; DatasheetVersion: Rev. J; PackageVersion: 121608-A; PackageReference: RJ-5; PackageDescription: 5-Pin Small Outline Transistor Package, Body 2.9 x 1.6 mm, Pitch 0.95 mm; Supplier Part Number 1: 1660983RL; Supplier Part Number 2: 1660983; Supplier Part Number 3: 12M9038; Slew Rate: 180V/us; Mounting Technology: Surface Mount; Code_JEDEC: MO-178-AA; ComponentLink1Description: Manufacturer URL; ComponentLink2Description: Datasheet; ComponentLink3Description: Package Specification; ComponentLink4Description: Reference Circuit
footprint SOT23-5 (Footprint not found)
pins: 1 VOUT (out), 2 -VS (power), 3 +IN (in), 4 -IN (in), 5 +VS (power)

## AD8065WARTZ-R7
designator U?
Single Channel Low Power Operational Amplifier, 145 MHz BW, 180 V/us SR, Automotive, 5-pin SOT23 (RJ-5), Reel; Generic Part Number: AD8065; PartNumber: AD8065WARTZ-R7; Amplifiers Per Package: 1; Automotive Qualified: Yes; Input Bias Current: 2pA; Input Offset Voltage: 400uV; Iq/Amp: 7.4mA; Small Signal Bandwidth: 145MHz; V Span Max: 24V; V Span Min: 5V; DatasheetVersion: Rev. J; PackageVersion: 121608-A; PackageReference: RJ-5; PackageDescription: 5-Pin Small Outline Transistor Package, Body 2.9 x 1.6 mm, Pitch 0.95 mm; Supplier Part Number 1: AD8065WARTZ-R7TR-ND; Supplier Part Number 2: AD8065WARTZ-R7CT-ND; Supplier Part Number 3: AD8065WARTZ-R7DKR-ND; Supplier Part Number 4: 91R2587; Slew Rate: 180V/us; Mounting Technology: Surface Mount; Code_JEDEC: MO-178-AA; ComponentLink1Description: Manufacturer URL; ComponentLink2Description: Datasheet; ComponentLink3Description: Package Specification; ComponentLink4Description: Reference Circuit
footprint SOT23-5 (Footprint not found)
pins: 1 VOUT (out), 2 -VS (power), 3 +IN (in), 4 -IN (in), 5 +VS (power)

## AD8066AR
designator U?
Double Channel Low Power Operational Amplifier, 145 MHz BW, 180 V/us SR, Industrial, 8-pin SOIC (R-8), Tube; Generic Part Number: AD8066; PartNumber: AD8066AR; Amplifiers Per Package: 2; Input Bias Current: 2pA; Input Offset Voltage: 400uV; Iq/Amp: 7.4mA; Small Signal Bandwidth: 145MHz; V Span Max: 24V; V Span Min: 5V; DatasheetVersion: Rev. J; PackageVersion: 060506-A; PackageReference: R-8; PackageDescription: 8-Pin Standard Small Outline Package, Body 3.9 x 4.9 mm, Pitch 1.27 mm; Supplier Part Number 1: AD8066AR-ND; Slew Rate: 180V/us; Mounting Technology: Surface Mount; Code_JEDEC: MS-012-AA; ComponentLink1Description: Manufacturer URL; ComponentLink2Description: Datasheet; ComponentLink3Description: Package Specification; ComponentLink4Description: Reference Circuit
footprint SOIC8_1.27 (Footprint not found)
pins on every part: 4 -VS (power), 8 +VS (power)
part A pins: 1 VOUT 1 (out), 2 -IN 1 (in), 3 +IN 1 (in)
part B pins: 5 +IN 2 (in), 6 -IN 2 (in), 7 VOUT 2 (out)

## AD8066ARM
designator U?
Double Channel Low Power Operational Amplifier, 145 MHz BW, 180 V/us SR, Industrial, 8-pin SOP (RM-8), Tube; Generic Part Number: AD8066; PartNumber: AD8066ARM; Amplifiers Per Package: 2; Input Bias Current: 2pA; Input Offset Voltage: 400uV; Iq/Amp: 7.4mA; Small Signal Bandwidth: 145MHz; V Span Max: 24V; V Span Min: 5V; DatasheetVersion: Rev. J; PackageReference: RM-8; PackageDescription: 8-Pin Mini Small Outline Package, Body 3 x 3 mm, Pitch 0.65 mm; Supplier Part Number 1: AD8066ARM-ND; Slew Rate: 180V/us; Mounting Technology: Surface Mount; Code_JEDEC: MO-187-AA; ComponentLink1Description: Manufacturer URL; ComponentLink2Description: Datasheet; ComponentLink3Description: Package Specification; ComponentLink4Description: Reference Circuit
footprint VSSOP8_0.65 (Footprint not found)
pins on every part: 4 -VS (power), 8 +VS (power)
part A pins: 1 VOUT 1 (out), 2 -IN 1 (in), 3 +IN 1 (in)
part B pins: 5 +IN 2 (in), 6 -IN 2 (in), 7 VOUT 2 (out)

## AD8066ARMZ
designator U?
Double Channel Low Power Operational Amplifier, 145 MHz BW, 180 V/us SR, Industrial, 8-pin SOP (RM-8), Tube; Generic Part Number: AD8066; PartNumber: AD8066ARMZ; Amplifiers Per Package: 2; Input Bias Current: 2pA; Input Offset Voltage: 400uV; Iq/Amp: 7.4mA; Small Signal Bandwidth: 145MHz; V Span Max: 24V; V Span Min: 5V; DatasheetVersion: Rev. J; PackageReference: RM-8; PackageDescription: 8-Pin Mini Small Outline Package, Body 3 x 3 mm, Pitch 0.65 mm; Supplier Part Number 1: AD8066ARMZ-ND; Supplier Part Number 2: 1660987; Supplier Part Number 3: 19M8882; Slew Rate: 180V/us; Mounting Technology: Surface Mount; Code_JEDEC: MO-187-AA; ComponentLink1Description: Manufacturer URL; ComponentLink2Description: Datasheet; ComponentLink3Description: Package Specification; ComponentLink4Description: Reference Circuit
footprint VSSOP8_0.65 (Footprint not found)
pins on every part: 4 -VS (power), 8 +VS (power)
part A pins: 1 VOUT 1 (out), 2 -IN 1 (in), 3 +IN 1 (in)
part B pins: 5 +IN 2 (in), 6 -IN 2 (in), 7 VOUT 2 (out)

## AD8067ARTZ-R2
designator U?
Single Channel Low Power Operational Amplifier, 54 MHz BW, 640 V/us SR, Industrial, 5-pin SOT23 (RJ-5), Reel; Generic Part Number: AD8067; PartNumber: AD8067ARTZ-R2; Amplifiers Per Package: 1; Input Bias Current: 600fA; Input Offset Voltage: 200uV; Iq/Amp: 7mA; Small Signal Bandwidth: 54MHz; V Span Max: 24V; V Span Min: 5V; DatasheetVersion: Rev. B; PackageVersion: 121608-A; PackageReference: RJ-5; PackageDescription: 5-Pin Small Outline Transistor Package, Body 2.9 x 1.6 mm, Pitch 0.95 mm; Supplier Part Number 1: AD8067ARTZ-R2CT-ND; Supplier Part Number 2: 1660988; Supplier Part Number 3: 1660988RL; Supplier Part Number 4: 19M8883; Slew Rate: 640V/us; Mounting Technology: Surface Mount; Code_JEDEC: MO-178-AA; ComponentLink1Description: Manufacturer URL; ComponentLink2Description: Datasheet; ComponentLink3Description: Package Specification
footprint SOT23-5 (Footprint not found)
pins: 1 VOUT (out), 2 -VS (power), 3 +IN (in), 4 -IN (in), 5 +VS (power)

## AD8072ARMZ
designator U?
Double Channel Very Low Cost Operational Amplifier, 100 MHz BW, 500 V/us SR, Industrial, 8-pin SOP (RM-8), Tube; Generic Part Number: AD8072; PartNumber: AD8072ARMZ; Amplifiers Per Package: 2; Input Bias Current: 4uA; Input Offset Voltage: 2mV; Iq/Amp: 5mA; Small Signal Bandwidth: 100MHz; V Span Max: 12V; V Span Min: 5V; DatasheetVersion: Rev. D; PackageReference: RM-8; PackageDescription: 8-Pin Mini Small Outline Package, Body 3 x 3 mm, Pitch 0.65 mm; Supplier Part Number 1: AD8072ARMZ-ND; Supplier Part Number 2: 59K6331; Packing: Tube; Slew Rate: 500V/us; Mounting Technology: Surface Mount; Code_JEDEC: MO-187-AA; ComponentLink1Description: Manufacturer URL; ComponentLink2Description: Datasheet; ComponentLink3Description: Package Specification
footprint VSSOP8_0.65 (Footprint not found)
pins on every part: 4 -VS (power), 8 +VS (power)
part A pins: 1 OUT 1 (out), 2 -IN 1 (in), 3 +IN 1 (in)
part B pins: 5 +IN 2 (in), 6 -IN 2 (in), 7 OUT 2 (out)

## AD8074ARU
designator U?
3 Channel Low Supply Current Operational Amplifier, 600 MHz BW, 1.6 KV/us SR, Industrial, 16-pin SOP (RU-16), Tube; Generic Part Number: AD8074; PartNumber: AD8074ARU; Amplifiers Per Package: 3; Input Bias Current: 5uA; Input Offset Voltage: 2.5mV; Iq/Amp: 10mA; Small Signal Bandwidth: 600MHz; V Span Max: 11V; V Span Min: 9V; DatasheetVersion: Rev. B; PackageReference: RU-16; PackageDescription: 16-Pin Thin Shrink Small Outline Package, Body 5 x 4.4 mm, Pitch 0.65 mm; Supplier Part Number 1: AD8074ARU-ND; Slew Rate: 1.6KV/us; Mounting Technology: Surface Mount; Code_JEDEC: MO-153AB; ComponentLink1Description: Manufacturer URL; ComponentLink2Description: Datasheet; ComponentLink3Description: Package Specification
footprint TSSOP16_0.65 (Footprint not found)
pins: 1 ~{OE} (in), 2 DGND (power), 3 IN 2 (in), 4 AGND (power), 5 IN 1 (in), 6 AGND (power), 7 IN 0 (in), 8 VEE (power), 9 VEE (power), 10 OUT 0 (hiz), 11 VCC (power), 12 OUT 1 (hiz), 13 VEE (power), 14 OUT 2 (hiz), 15 VCC (power), 16 VCC (power)

## AD8079AR
designator U?
Double Channel Low Power Operational Amplifier, 260 MHz BW, 800 V/us SR, Industrial, 8-pin SOIC (R-8), Tube; Generic Part Number: AD8079; PartNumber: AD8079AR; Amplifiers Per Package: 2; Input Bias Current: 3uA; Input Offset Voltage: 5mV; Iq/Amp: 10mA; Small Signal Bandwidth: 260MHz; V Span Max: 12V; V Span Min: 6V; DatasheetVersion: Rev. A; PackageVersion: 060506-A; PackageReference: R-8; PackageDescription: 8-Pin Standard Small Outline Package, Body 3.9 x 4.9 mm, Pitch 1.27 mm; Supplier Part Number 1: AD8079AR-ND; Packing: Tube; Slew Rate: 800V/us; Mounting Technology: Surface Mount; Code_JEDEC: MS-012-AA; ComponentLink1Description: Manufacturer URL; ComponentLink2Description: Datasheet; ComponentLink3Description: Package Specification
footprint SOIC8_1.27 (Footprint not found)
pins: 1 +IN 1 (in), 2 GND (power), 3 GND (power), 4 +IN 2 (in), 5 OUT 2 (out), 6 -VS (power), 7 +VS (power), 8 OUT 1 (out)

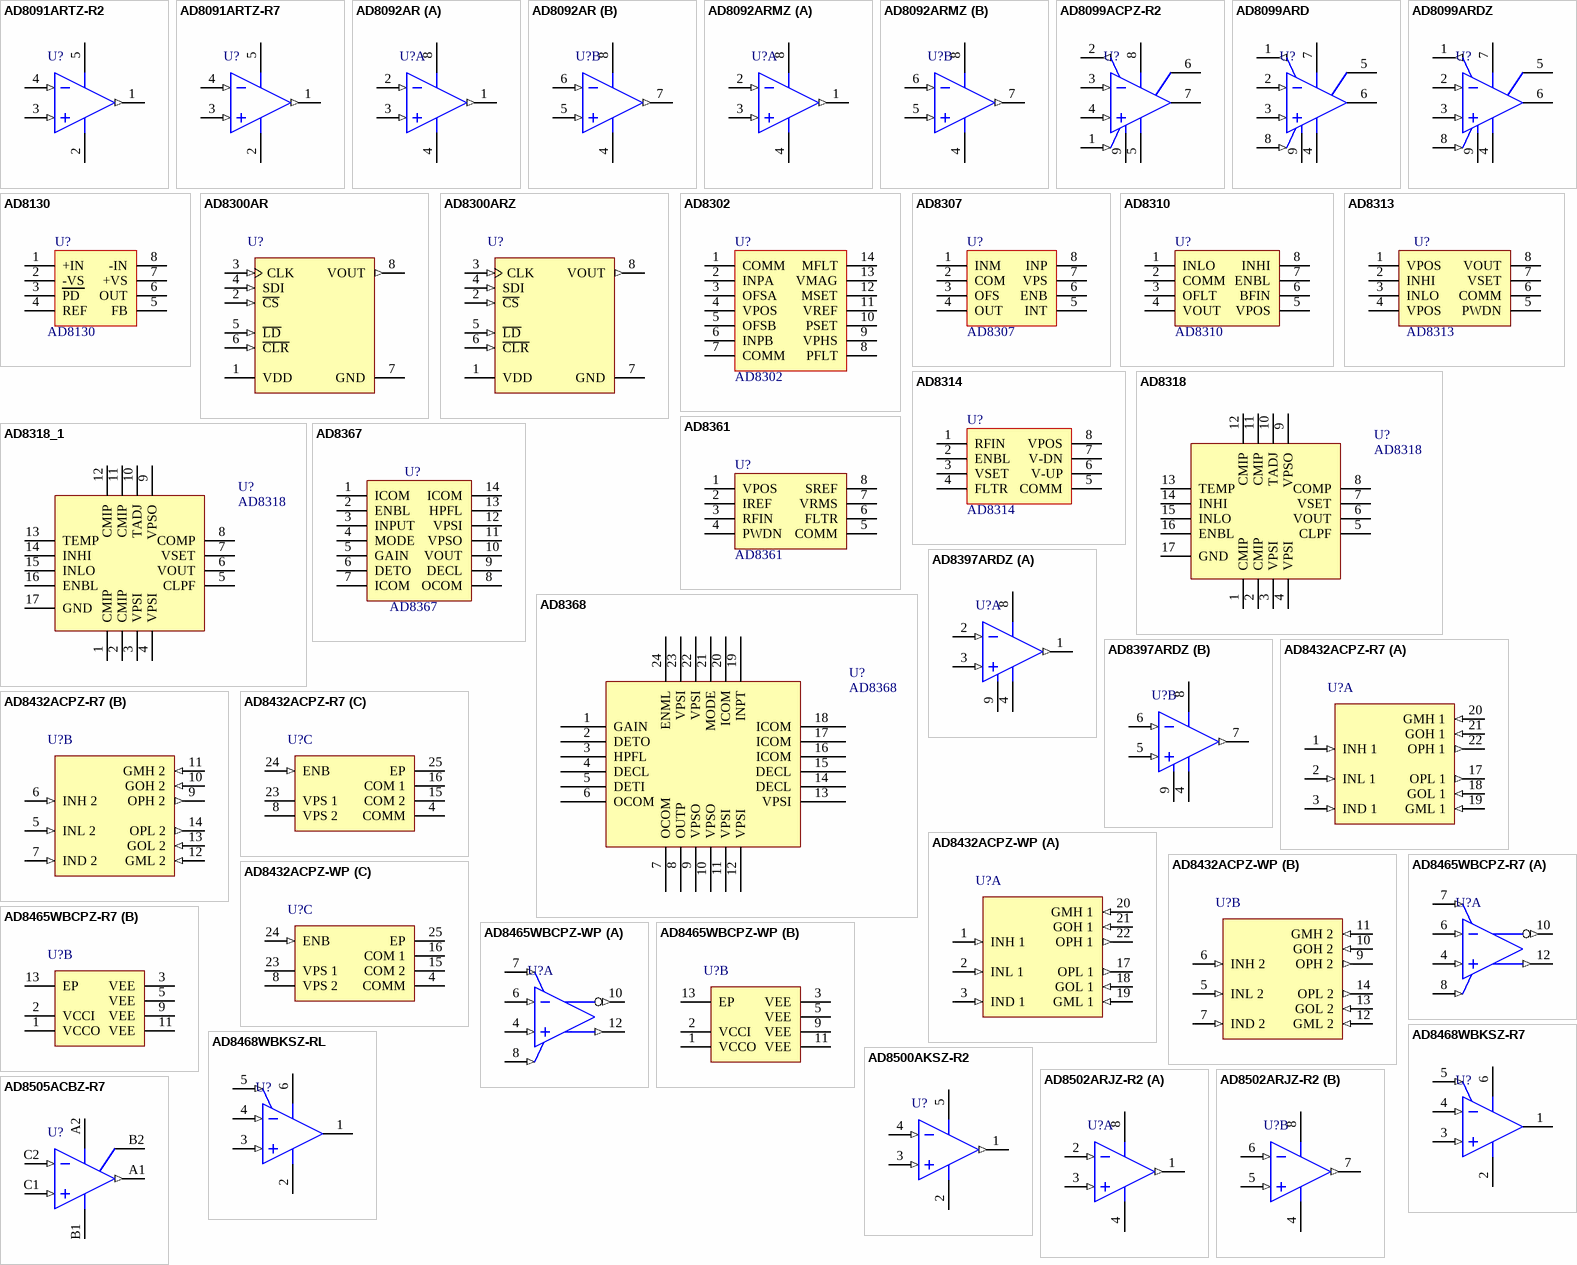
[diagram p94: symbols AD8091ARTZ-R2 to AD8505ACBZ-R7]

## AD8091ARTZ-R2
designator U?
Single Channel Single-Supply Operation Operational Amplifier, 110 MHz BW, 170 V/us SR, Industrial, 5-pin SOT23 (RJ-5), Reel; Generic Part Number: AD8091; PartNumber: AD8091ARTZ-R2; Amplifiers Per Package: 1; Input Bias Current: 1.3uA; Input Offset Voltage: 1.6mV; Iq/Amp: 5.5mA; Small Signal Bandwidth: 110MHz; V Span Max: 12V; V Span Min: 3V; DatasheetVersion: Rev. C; PackageVersion: 121608-A; PackageReference: RJ-5; PackageDescription: 5-Pin Small Outline Transistor Package, Body 2.9 x 1.6 mm, Pitch 0.95 mm; Slew Rate: 170V/us; Mounting Technology: Surface Mount; Code_JEDEC: MO-178-AA; ComponentLink1Description: Manufacturer URL; ComponentLink2Description: Datasheet; ComponentLink3Description: Package Specification
footprint SOT23-5 (Footprint not found)
pins: 1 VOUT (out), 2 -VS (power), 3 +IN (in), 4 -IN (in), 5 +VS (power)

## AD8091ARTZ-R7
designator U?
Single Channel Single-Supply Operation Operational Amplifier, 110 MHz BW, 170 V/us SR, Industrial, 5-pin SOT23 (RJ-5), Reel; Generic Part Number: AD8091; PartNumber: AD8091ARTZ-R7; Amplifiers Per Package: 1; Input Bias Current: 1.3uA; Input Offset Voltage: 1.6mV; Iq/Amp: 5.5mA; Small Signal Bandwidth: 110MHz; V Span Max: 12V; V Span Min: 3V; DatasheetVersion: Rev. C; PackageVersion: 121608-A; PackageReference: RJ-5; PackageDescription: 5-Pin Small Outline Transistor Package, Body 2.9 x 1.6 mm, Pitch 0.95 mm; Supplier Part Number 1: AD8091ARTZ-R7TR-ND; Supplier Part Number 2: AD8091ARTZ-R7CT-ND; Supplier Part Number 3: AD8091ARTZ-R7DKR-ND; Supplier Part Number 4: 67W2742; Supplier Part Number 5: 59K6348; Slew Rate: 170V/us; Mounting Technology: Surface Mount; Code_JEDEC: MO-178-AA; ComponentLink1Description: Manufacturer URL; ComponentLink2Description: Datasheet; ComponentLink3Description: Package Specification
footprint SOT23-5 (Footprint not found)
pins: 1 VOUT (out), 2 -VS (power), 3 +IN (in), 4 -IN (in), 5 +VS (power)

## AD8092AR
designator U?
Double Channel Single-Supply Operation Operational Amplifier, 110 MHz BW, 170 V/us SR, Industrial, 8-pin SOIC (R-8), Tube; Generic Part Number: AD8092; PartNumber: AD8092AR; Amplifiers Per Package: 2; Input Bias Current: 1.3uA; Input Offset Voltage: 1.6mV; Iq/Amp: 5.5mA; Small Signal Bandwidth: 110MHz; V Span Max: 12V; V Span Min: 3V; DatasheetVersion: Rev. C; PackageVersion: 060506-A; PackageReference: R-8; PackageDescription: 8-Pin Standard Small Outline Package, Body 3.9 x 4.9 mm, Pitch 1.27 mm; Supplier Part Number 1: AD8092AR-ND; Slew Rate: 170V/us; Mounting Technology: Surface Mount; Code_JEDEC: MS-012-AA; ComponentLink1Description: Manufacturer URL; ComponentLink2Description: Datasheet; ComponentLink3Description: Package Specification
footprint SOIC8_1.27 (Footprint not found)
pins on every part: 4 -VS (power), 8 +VS (power)
part A pins: 1 OUT 1 (out), 2 -IN 1 (in), 3 +IN 1 (in)
part B pins: 5 +IN 2 (in), 6 -IN 2 (in), 7 OUT 2 (out)

## AD8092ARMZ
designator U?
Double Channel Single-Supply Operation Operational Amplifier, 110 MHz BW, 170 V/us SR, Industrial, 8-pin SOP (RM-8), Tube; Generic Part Number: AD8092; PartNumber: AD8092ARMZ; Amplifiers Per Package: 2; Input Bias Current: 1.3uA; Input Offset Voltage: 1.6mV; Iq/Amp: 5.5mA; Small Signal Bandwidth: 110MHz; V Span Max: 12V; V Span Min: 3V; DatasheetVersion: Rev. C; PackageReference: RM-8; PackageDescription: 8-Pin Mini Small Outline Package, Body 3 x 3 mm, Pitch 0.65 mm; Supplier Part Number 1: AD8092ARMZ-ND; Supplier Part Number 2: 88H0169; Slew Rate: 170V/us; Mounting Technology: Surface Mount; Code_JEDEC: MO-187-AA; ComponentLink1Description: Manufacturer URL; ComponentLink2Description: Datasheet; ComponentLink3Description: Package Specification
footprint VSSOP8_0.65 (Footprint not found)
pins on every part: 4 -VS (power), 8 +VS (power)
part A pins: 1 OUT 1 (out), 2 -IN 1 (in), 3 +IN 1 (in)
part B pins: 5 +IN 2 (in), 6 -IN 2 (in), 7 OUT 2 (out)